# Altium footprint library TX2-Baseboard.PcbLib: 47 footprints (part 2 of 3)
Each footprint in its own frame and in the unit in brackets; x right, y up, seen from the top. Pads: shape width x height; smd on the part's side, far side on the other; paste and mask are expansions set on the pad; w line width, h text height; cw(c..) or ccw(c..) is an arc to the next point about the centre after c.
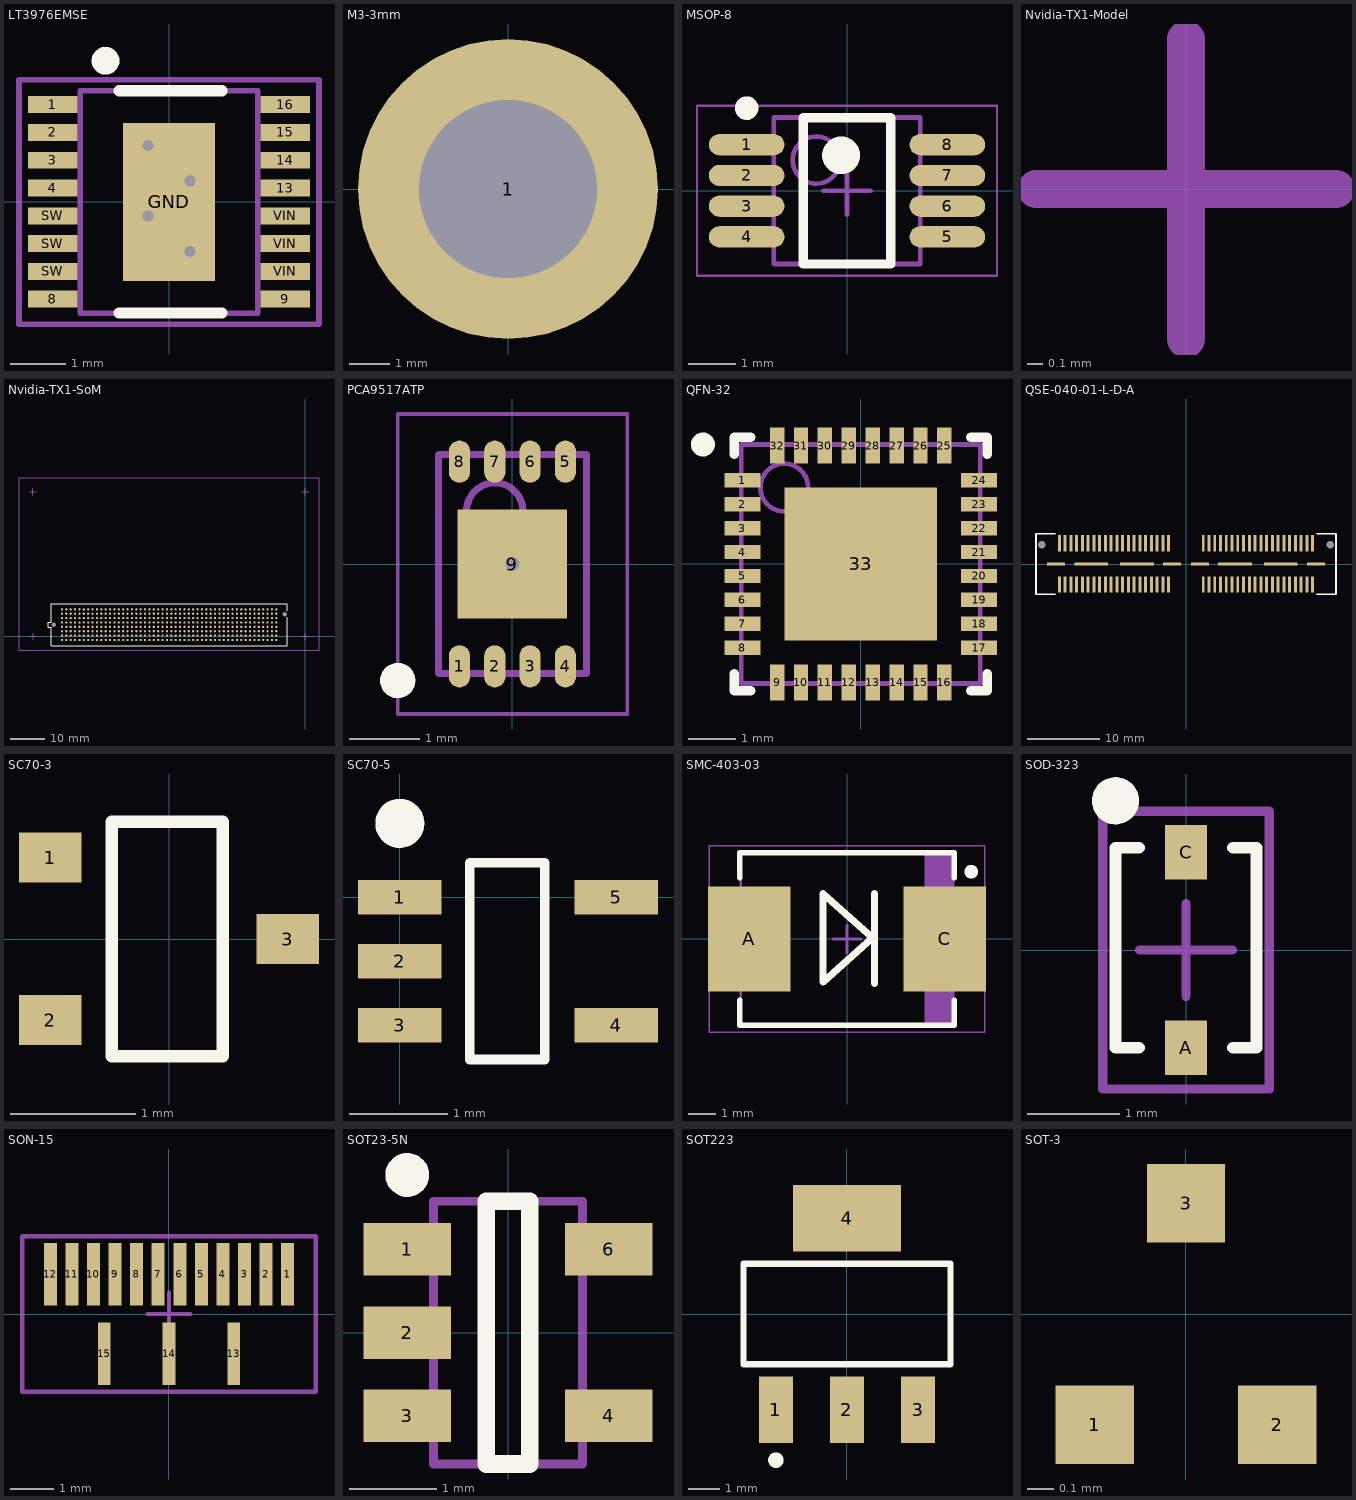
[diagram p1: the footprints below, top view; thin cyan lines are the x and y axes]

## LT3976EMSE [mm]
height 1.1
pads (17):
  rect 0.889x0.305 smd: 1(-2.095,1.75) 2(-2.095,1.25) 3(-2.095,0.75) 4(-2.095,0.25) 8(-2.095,-1.75) 9(2.095,-1.75) 13(2.095,0.25) 14(2.095,0.75) 15(2.095,1.25) 16(2.095,1.75) SW(-2.095,-1.25) SW(-2.095,-0.75) SW(-2.095,-0.25) VIN(2.095,-1.25) VIN(2.095,-0.75) VIN(2.095,-0.25)
  rect 1.651x2.845 smd: GND(0,0)
via 0.381,-0.889 diameter 0.55 hole 0.2
via -0.381,-0.254 diameter 0.55 hole 0.2
via 0.381,0.381 diameter 0.55 hole 0.2
via -0.381,1.016 diameter 0.55 hole 0.2
Top Overlay:
  circle w0.25: c-1.143,2.54 r0.125
  lines w0.2: -0.895,-2 0.954,-2 ; -0.895,2 0.954,2
Mechanical 13:
  lines w0.1: -1.6,-2 1.6,-2 1.6,2 -1.6,2 -1.6,-2
Mechanical 15:
  lines w0.1: -0.5,0 0.5,0 ; 0,-0.5 0,0.5 ; -2.7,-2.2 2.7,-2.2 2.7,2.2 -0.5,2.2 -2.7,2.2 -2.7,-2.2
3D body: height 1.1, standoff 0.1, extent -1.651,-2.032 1.651,2.032

## M3-3mm [mm] "SMT Steel Spacer, M3 Thread Internal, 3mm"
height 3
pads (1):
  round 7.4 / inner round 0 / far side round 0 hole 4.4 unplated paste-403.566: 1(0,0)
Top Paste:
  drawing of 4 lines, arcs and shapes, not listed
Mechanical 13:
  circle w0.12: c0,0 r3
3D body: height 3, standoff -1.4, extent -2.994,-3 2.994,2.976

## MSOP-8 [mm]
height 1.1
pads (8):
  oval 1.6x0.45 smd: 1(-2.125,0.975) 2(-2.125,0.325) 3(-2.125,-0.325) 4(-2.125,-0.975) 5(2.125,-0.975) 6(2.125,-0.325) 7(2.125,0.325) 8(2.125,0.975)
Top Overlay:
  circle w0.25: c-2.125,1.75 r0.125
  circle w0.4: c-0.125,0.75 r0.2
  lines w0.2: -0.925,-1.55 -0.925,1.55 0.925,1.55 0.925,-1.55 -0.925,-1.55
Mechanical 13:
  circle w0.1: c-0.65,0.65 r0.5
  lines w0.1: -1.55,-1.55 -1.55,1.55 1.55,1.55 1.55,-1.55 -1.55,-1.55
Mechanical 15:
  lines w0.05: -3.175,-1.8 -3.175,1.8 3.175,1.8 3.175,-1.8 -3.175,-1.8
  lines w0.1: -0.5,0 0.5,0 ; 0,-0.5 0,0.5
3D body: height 1.15, standoff 0, extent -2.45,-1.524 2.45,1.476

## Nvidia-TX1-Model [mm]
Mechanical 3:
  lines w0.254: -1,0 1,0 ; 0,-1 0,1
3D body: height 14.16, standoff 1.95, extent -4,-46 83,4

## Nvidia-TX1-SoM [mm]
pads (402):
  round 0 hole 1.27: 0(-73.033,3.43) 0(-5.953,6.48)
  round 0.64 smd: A1(-70.609,-1.015) A2(-69.339,-1.015) A3(-68.069,-1.015) A4(-66.799,-1.015) A5(-65.529,-1.015) A6(-64.259,-1.015) A7(-62.989,-1.015) A8(-61.719,-1.015) A9(-60.449,-1.015) A10(-59.179,-1.015) A11(-57.909,-1.015) A12(-56.639,-1.015) A13(-55.369,-1.015) A14(-54.099,-1.015) A15(-52.829,-1.015) A16(-51.559,-1.015) A17(-50.289,-1.015) A18(-49.019,-1.015) A19(-47.749,-1.015) A20(-46.479,-1.015) A21(-45.209,-1.015) A22(-43.939,-1.015) A23(-42.669,-1.015) A24(-41.399,-1.015) A25(-40.129,-1.015) A26(-38.859,-1.015) A27(-37.589,-1.015) A28(-36.319,-1.015) A29(-35.049,-1.015) A30(-33.779,-1.015) A31(-32.509,-1.015) A32(-31.239,-1.015) A33(-29.969,-1.015) A34(-28.699,-1.015) A35(-27.429,-1.015) A36(-26.159,-1.015) A37(-24.889,-1.015) A38(-23.619,-1.015) A39(-22.349,-1.015) A40(-21.079,-1.015) A41(-19.809,-1.015) A42(-18.539,-1.015) A43(-17.269,-1.015) A44(-15.999,-1.015) A45(-14.729,-1.015) A46(-13.459,-1.015) A47(-12.189,-1.015) A48(-10.919,-1.015) A49(-9.649,-1.015) A50(-8.379,-1.015) B1(-70.609,0.255) B2(-69.339,0.255) B3(-68.069,0.255) B4(-66.799,0.255) B5(-65.529,0.255) B6(-64.259,0.255) B7(-62.989,0.255) B8(-61.719,0.255) B9(-60.449,0.255) B10(-59.179,0.255) B11(-57.909,0.255) B12(-56.639,0.255) B13(-55.369,0.255) B14(-54.099,0.255) B15(-52.829,0.255) B16(-51.559,0.255) B17(-50.289,0.255) B18(-49.019,0.255) B19(-47.749,0.255) B20(-46.479,0.255) B21(-45.209,0.255) B22(-43.939,0.255) B23(-42.669,0.255) B24(-41.399,0.255) B25(-40.129,0.255) B26(-38.859,0.255) B27(-37.589,0.255) B28(-36.319,0.255) B29(-35.049,0.255) B30(-33.779,0.255) B31(-32.509,0.255) B32(-31.239,0.255) B33(-29.969,0.255) B34(-28.699,0.255) B35(-27.429,0.255) B36(-26.159,0.255) B37(-24.889,0.255) B38(-23.619,0.255) B39(-22.349,0.255) B40(-21.079,0.255) B41(-19.809,0.255) B42(-18.539,0.255) B43(-17.269,0.255) B44(-15.999,0.255) B45(-14.729,0.255) B46(-13.459,0.255) B47(-12.189,0.255) B48(-10.919,0.255) B49(-9.649,0.255) B50(-8.379,0.255) C1(-70.609,1.525) C2(-69.339,1.525) C3(-68.069,1.525) C4(-66.799,1.525) C5(-65.529,1.525) C6(-64.259,1.525) C7(-62.989,1.525) C8(-61.719,1.525) C9(-60.449,1.525) C10(-59.179,1.525) C11(-57.909,1.525) C12(-56.639,1.525) C13(-55.369,1.525) C14(-54.099,1.525) C15(-52.829,1.525) C16(-51.559,1.525) C17(-50.289,1.525) C18(-49.019,1.525) C19(-47.749,1.525) C20(-46.479,1.525) C21(-45.209,1.525) C22(-43.939,1.525) C23(-42.669,1.525) C24(-41.399,1.525) C25(-40.129,1.525) C26(-38.859,1.525) C27(-37.589,1.525) C28(-36.319,1.525) C29(-35.049,1.525) C30(-33.779,1.525) C31(-32.509,1.525) C32(-31.239,1.525) C33(-29.969,1.525) C34(-28.699,1.525) C35(-27.429,1.525) C36(-26.159,1.525) C37(-24.889,1.525) C38(-23.619,1.525) C39(-22.349,1.525) C40(-21.079,1.525) C41(-19.809,1.525) C42(-18.539,1.525) C43(-17.269,1.525) C44(-15.999,1.525) C45(-14.729,1.525) C46(-13.459,1.525) C47(-12.189,1.525) C48(-10.919,1.525) C49(-9.649,1.525) C50(-8.379,1.525) D1(-70.609,2.795) D2(-69.339,2.795) D3(-68.069,2.795) D4(-66.799,2.795) D5(-65.529,2.795) D6(-64.259,2.795) D7(-62.989,2.795) D8(-61.719,2.795) D9(-60.449,2.795) D10(-59.179,2.795) D11(-57.909,2.795) D12(-56.639,2.795) D13(-55.369,2.795) D14(-54.099,2.795) D15(-52.829,2.795) D16(-51.559,2.795) D17(-50.289,2.795) D18(-49.019,2.795) D19(-47.749,2.795) D20(-46.479,2.795) D21(-45.209,2.795) D22(-43.939,2.795) D23(-42.669,2.795) D24(-41.399,2.795) D25(-40.129,2.795) D26(-38.859,2.795) D27(-37.589,2.795) D28(-36.319,2.795) D29(-35.049,2.795) D30(-33.779,2.795) D31(-32.509,2.795) D32(-31.239,2.795) D33(-29.969,2.795) D34(-28.699,2.795) D35(-27.429,2.795) D36(-26.159,2.795) D37(-24.889,2.795) D38(-23.619,2.795) D39(-22.349,2.795) D40(-21.079,2.795) D41(-19.809,2.795) D42(-18.539,2.795) D43(-17.269,2.795) D44(-15.999,2.795) D45(-14.729,2.795) D46(-13.459,2.795) D47(-12.189,2.795) D48(-10.919,2.795) D49(-9.649,2.795) D50(-8.379,2.795) E1(-70.609,4.065) E2(-69.339,4.065) E3(-68.069,4.065) E4(-66.799,4.065) E5(-65.529,4.065) E6(-64.259,4.065) E7(-62.989,4.065) E8(-61.719,4.065) E9(-60.449,4.065) E10(-59.179,4.065) E11(-57.909,4.065) E12(-56.639,4.065) E13(-55.369,4.065) E14(-54.099,4.065) E15(-52.829,4.065) E16(-51.559,4.065) E17(-50.289,4.065) E18(-49.019,4.065) E19(-47.749,4.065) E20(-46.479,4.065) E21(-45.209,4.065) E22(-43.939,4.065) E23(-42.669,4.065) E24(-41.399,4.065) E25(-40.129,4.065) E26(-38.859,4.065) E27(-37.589,4.065) E28(-36.319,4.065) E29(-35.049,4.065) E30(-33.779,4.065) E31(-32.509,4.065) E32(-31.239,4.065) E33(-29.969,4.065) E34(-28.699,4.065) E35(-27.429,4.065) E36(-26.159,4.065) E37(-24.889,4.065) E38(-23.619,4.065) E39(-22.349,4.065) E40(-21.079,4.065) E41(-19.809,4.065) E42(-18.539,4.065) E43(-17.269,4.065) E44(-15.999,4.065) E45(-14.729,4.065) E46(-13.459,4.065) E47(-12.189,4.065) E48(-10.919,4.065) E49(-9.649,4.065) E50(-8.379,4.065) F1(-70.609,5.335) F2(-69.339,5.335) F3(-68.069,5.335) F4(-66.799,5.335) F5(-65.529,5.335) F6(-64.259,5.335) F7(-62.989,5.335) F8(-61.719,5.335) F9(-60.449,5.335) F10(-59.179,5.335) F11(-57.909,5.335) F12(-56.639,5.335) F13(-55.369,5.335) F14(-54.099,5.335) F15(-52.829,5.335) F16(-51.559,5.335) F17(-50.289,5.335) F18(-49.019,5.335) F19(-47.749,5.335) F20(-46.479,5.335) F21(-45.209,5.335) F22(-43.939,5.335) F23(-42.669,5.335) F24(-41.399,5.335) F25(-40.129,5.335) F26(-38.859,5.335) F27(-37.589,5.335) F28(-36.319,5.335) F29(-35.049,5.335) F30(-33.779,5.335) F31(-32.509,5.335) F32(-31.239,5.335) F33(-29.969,5.335) F34(-28.699,5.335) F35(-27.429,5.335) F36(-26.159,5.335) F37(-24.889,5.335) F38(-23.619,5.335) F39(-22.349,5.335) F40(-21.079,5.335) F41(-19.809,5.335) F42(-18.539,5.335) F43(-17.269,5.335) F44(-15.999,5.335) F45(-14.729,5.335) F46(-13.459,5.335) F47(-12.189,5.335) F48(-10.919,5.335) F49(-9.649,5.335) F50(-8.379,5.335) G1(-70.609,6.605) G2(-69.339,6.605) G3(-68.069,6.605) G4(-66.799,6.605) G5(-65.529,6.605) G6(-64.259,6.605) G7(-62.989,6.605) G8(-61.719,6.605) G9(-60.449,6.605) G10(-59.179,6.605) G11(-57.909,6.605) G12(-56.639,6.605) G13(-55.369,6.605) G14(-54.099,6.605) G15(-52.829,6.605) G16(-51.559,6.605) G17(-50.289,6.605) G18(-49.019,6.605) G19(-47.749,6.605) G20(-46.479,6.605) G21(-45.209,6.605) G22(-43.939,6.605) G23(-42.669,6.605) G24(-41.399,6.605) G25(-40.129,6.605) G26(-38.859,6.605) G27(-37.589,6.605) G28(-36.319,6.605) G29(-35.049,6.605) G30(-33.779,6.605) G31(-32.509,6.605) G32(-31.239,6.605) G33(-29.969,6.605) G34(-28.699,6.605) G35(-27.429,6.605) G36(-26.159,6.605) G37(-24.889,6.605) G38(-23.619,6.605) G39(-22.349,6.605) G40(-21.079,6.605) G41(-19.809,6.605) G42(-18.539,6.605) G43(-17.269,6.605) G44(-15.999,6.605) G45(-14.729,6.605) G46(-13.459,6.605) G47(-12.189,6.605) G48(-10.919,6.605) G49(-9.649,6.605) G50(-8.379,6.605) H1(-70.609,7.875) H2(-69.339,7.875) H3(-68.069,7.875) H4(-66.799,7.875) H5(-65.529,7.875) H6(-64.259,7.875) H7(-62.989,7.875) H8(-61.719,7.875) H9(-60.449,7.875) H10(-59.179,7.875) H11(-57.909,7.875) H12(-56.639,7.875) H13(-55.369,7.875) H14(-54.099,7.875) H15(-52.829,7.875) H16(-51.559,7.875) H17(-50.289,7.875) H18(-49.019,7.875) H19(-47.749,7.875) H20(-46.479,7.875) H21(-45.209,7.875) H22(-43.939,7.875) H23(-42.669,7.875) H24(-41.399,7.875) H25(-40.129,7.875) H26(-38.859,7.875) H27(-37.589,7.875) H28(-36.319,7.875) H29(-35.049,7.875) H30(-33.779,7.875) H31(-32.509,7.875) H32(-31.239,7.875) H33(-29.969,7.875) H34(-28.699,7.875) H35(-27.429,7.875) H36(-26.159,7.875) H37(-24.889,7.875) H38(-23.619,7.875) H39(-22.349,7.875) H40(-21.079,7.875) H41(-19.809,7.875) H42(-18.539,7.875) H43(-17.269,7.875) H44(-15.999,7.875) H45(-14.729,7.875) H46(-13.459,7.875) H47(-12.189,7.875) H48(-10.919,7.875) H49(-9.649,7.875) H50(-8.379,7.875)
Top Overlay:
  lines w0.15: -5.253,5.6 -5.253,-2.64 -73.733,-2.64 -73.733,2.67 -74.623,2.67 -74.623,4.19 -73.733,4.19 -73.733,9.5 -5.253,9.5 -5.253,7.475
Mechanical 3:
  lines w0.1: -83.075,-4 4.025,-4 4.025,46.075 -83.075,46.075 -83.075,-4
  lines w0.254: -80,0 -78,0 ; -80,42 -78,42 ; -79.025,41.025 -79.025,43.025 ; -79,-1 -79,1 ; -1,0 1,0 ; -1,42 1,42 ; 0,-1 0,1 ; 0,41 0,43
3D body: height 5.54, standoff -1.34, extent -74.608,-2.64 -5.241,9.501

## PCA9517ATP [mm]
height 0.75
pads (9):
  oval 0.3x0.6 smd: 1(-0.75,-1.45) 2(-0.25,-1.45) 3(0.25,-1.45) 4(0.75,-1.45) 5(0.75,1.45) 6(0.25,1.45) 7(-0.25,1.45) 8(-0.75,1.45)
  rect 1.55x1.55 smd: 9(0,0)
via 0,0 diameter 0.5 hole 0.2
Top Overlay:
  circle w0.25: c-1.625,-1.651 r0.125
Mechanical 13:
  circle w0.1: c-0.25,0.75 r0.4
  lines w0.1: -1.05,-1.55 1.05,-1.55 1.05,1.55 -1.05,1.55 -1.05,-1.55
Mechanical 15:
  lines w0.05: -1.625,-2.125 1.625,-2.125 1.625,2.125 -1.625,2.125 -1.625,-2.125
  lines w0.1: -0.5,0 0.5,0 ; 0,-0.5 0,0.5
3D body: height 0.75, standoff 0.02, extent -1.05,-1.55 1.05,1.55

## QFN-32 [mm] "QFN, 32-Leads, Body 5,00x5,00mm, Pitch 0,50mm, Thermal Pad 3,20x3,20mm, IPC Medium Density"
height 1
pads (33):
  rect 0.75x0.3 smd: 1(-2.475,1.75) 2(-2.475,1.25) 3(-2.475,0.75) 4(-2.475,0.25) 5(-2.475,-0.25) 6(-2.475,-0.75) 7(-2.475,-1.25) 8(-2.475,-1.75) 17(2.475,-1.75) 18(2.475,-1.25) 19(2.475,-0.75) 20(2.475,-0.25) 21(2.475,0.25) 22(2.475,0.75) 23(2.475,1.25) 24(2.475,1.75)
  rect 0.3x0.75 smd: 9(-1.75,-2.475) 10(-1.25,-2.475) 11(-0.75,-2.475) 12(-0.25,-2.475) 13(0.25,-2.475) 14(0.75,-2.475) 15(1.25,-2.475) 16(1.75,-2.475) 25(1.75,2.475) 26(1.25,2.475) 27(0.75,2.475) 28(0.25,2.475) 29(-0.25,2.475) 30(-0.75,2.475) 31(-1.25,2.475) 32(-1.75,2.475)
  rect 3.2x3.2 smd: 33(0,0)
Top Overlay:
  circle w0.25: c-3.3,2.5 r0.125
  lines w0.2: -2.65,-2.3 -2.65,-2.65 -2.3,-2.65 ; -2.65,2.3 -2.65,2.65 -2.3,2.65 ; 2.3,-2.65 2.65,-2.65 2.65,-2.3 ; 2.3,2.65 2.65,2.65 2.65,2.3
Mechanical 13:
  circle w0.1: c-1.6,1.6 r0.5
  lines w0.1: -2.5,-2.5 2.5,-2.5 2.5,2.5 -2.5,2.5 -2.5,-2.5
3D body: height 0.25, standoff 0, extent -2.5,-2.5 2.5,2.5
3D body: height 1, standoff 0.05, extent -2.5,-2.5 2.5,2.5

## QSE-040-01-L-D-A [mm]
pads (90):
  round 0 hole 1.02: 0(-20.065,2.665) 0(20.065,2.665)
  rect 0.41x2.27 smd: 1(-17.603,-2.86) 2(-17.603,2.87) 3(-16.803,-2.86) 4(-16.803,2.87) 5(-16.003,-2.86) 6(-16.003,2.87) 7(-15.203,-2.86) 8(-15.203,2.87) 9(-14.403,-2.86) 10(-14.403,2.87) 11(-13.603,-2.86) 12(-13.603,2.87) 13(-12.803,-2.86) 14(-12.803,2.87) 15(-12.003,-2.86) 16(-12.003,2.87) 17(-11.203,-2.86) 18(-11.203,2.87) 19(-10.403,-2.86) 20(-10.403,2.87) 21(-9.603,-2.86) 22(-9.603,2.87) 23(-8.803,-2.86) 24(-8.803,2.87) 25(-8.003,-2.86) 26(-8.003,2.87) 27(-7.203,-2.86) 28(-7.203,2.87) 29(-6.403,-2.86) 30(-6.403,2.87) 31(-5.603,-2.86) 32(-5.603,2.87) 33(-4.803,-2.86) 34(-4.803,2.87) 35(-4.003,-2.86) 36(-4.003,2.87) 37(-3.203,-2.86) 38(-3.203,2.87) 39(-2.403,-2.86) 40(-2.403,2.87) 41(2.4,-2.86) 42(2.4,2.87) 43(3.2,-2.86) 44(3.2,2.87) 45(4,-2.86) 46(4,2.87) 47(4.8,-2.86) 48(4.8,2.87) 49(5.6,-2.86) 50(5.6,2.87) 51(6.4,-2.86) 52(6.4,2.87) 53(7.2,-2.86) 54(7.2,2.87) 55(8,-2.86) 56(8,2.87) 57(8.8,-2.86) 58(8.8,2.87) 59(9.6,-2.86) 60(9.6,2.87) 61(10.4,-2.86) 62(10.4,2.87) 63(11.2,-2.86) 64(11.2,2.87) 65(12,-2.86) 66(12,2.87) 67(12.8,-2.86) 68(12.8,2.87) 69(13.6,-2.86) 70(13.6,2.87) 71(14.4,-2.86) 72(14.4,2.87) 73(15.2,-2.86) 74(15.2,2.87) 75(16,-2.86) 76(16,2.87) 77(16.8,-2.86) 78(16.8,2.87) 79(17.6,-2.86) 80(17.6,2.87)
  rect 2.54x0.43 smd: 81(-18.069,-0.002) 84(-1.942,-0.002) 85(1.942,-0.001) 88(18.069,-0.001)
  rect 4.7x0.43 smd: 82(-13.178,-0.002) 83(-6.832,-0.001) 86(6.832,-0.001) 87(13.178,-0.001)
Top Overlay:
  lines w0.254: -18.2,-4.2 -20.86,-4.2 -20.86,4.2 -18.2,4.2 ; 18.2,-4.2 20.86,-4.2 20.86,4.2 18.2,4.2
3D body: height 3.23, standoff -0.34, extent -20.64,-3.737 20.635,3.756

## SC70-3 [mm] "SC70, 3-Leads, Pitch 0,65mm, EIAJ SC-88a"
height 1.1
pads (3):
  rect 0.5x0.4 smd: 1(-0.95,0.65) 2(-0.95,-0.65) 3(0.95,0)
Top Overlay:
  lines w0.1: -0.457,-0.94 0.432,-0.94 0.432,0.94 -0.457,0.94 -0.457,-0.94
3D body: height 1, standoff 0, extent -1.15,-1.075 1.15,1.025

## SC70-5 [mm] "SC70, 5-Leads, Pitch 0,65mm, EIAJ SC-88a"
height 1.1
pads (5):
  rect 0.85x0.35 smd: 1(0,0) 2(0,-0.65) 3(0,-1.3) 4(2.2,-1.3) 5(2.2,0)
Top Overlay:
  circle w0.25: c0,0.75 r0.125
  lines w0.1: 0.711,-1.65 1.473,-1.65 1.473,0.35 0.711,0.35 0.711,-1.65
3D body: height 0.96, standoff 0.01, extent 0.068,-1.635 2.168,0.365

## SMC-403-03 [mm] "SMC-403-03 package"
height 2.13
pads (2):
  rect 3x3.81 smd: A(-3.56,0) C(3.56,0)
Top Overlay:
  circle w0.25: c4.525,2.45 r0.125
  lines w0.2: -3.9,-2.225 -3.9,-3.15 3.9,-3.15 3.9,-2.225 ; -3.9,2.225 -3.9,3.15 3.9,3.15 3.9,2.225
  lines w0.254: 1,-1.625 1,1.65 ; -0.875,-1.575 -0.875,1.65 0.925,0.05 -0.875,-1.575
Mechanical 13:
  rectangle: 2.833,-3.126 3.875,3.124
  lines w0.1: -3.875,-3.125 3.875,-3.125 3.875,3.125 -3.875,3.125 -3.875,-3.125
Mechanical 15:
  lines w0.05: -5.025,-3.4 5.025,-3.4 5.025,3.4 -5.025,3.4 -5.025,-3.4
  lines w0.1: -0.5,0 0.5,0 ; 0,-0.5 0,0.5
3D body: height 2.2, standoff 0, extent -4.125,-3.125 3.875,2.825

## SOD-323 [mm]
pads (2):
  rect 0.45x0.59 smd: A(0,-1.055) C(0,1.055)
Top Overlay:
  circle w0.254: c-0.762,1.612 r0.127
  lines w0.127: -0.508,-1.055 -0.762,-1.055 -0.762,1.104 -0.508,1.104 ; 0.508,-1.055 0.762,-1.055 0.762,1.104 0.508,1.104
Mechanical 15:
  lines w0.1: -0.5,0 0.5,0 ; 0,-0.5 0,0.5 ; -0.9,-1.5 -0.9,1.5 0,1.5 0.9,1.5 0.9,-1.5 -0.9,-1.5
3D body: height 1, standoff 0.01, extent -0.625,-1.25 0.625,1.25

## SON-15 [mm]
height 0.8
pads (15):
  rect 0.3x1.45 smd: 1(2.75,0.925) 2(2.25,0.925) 3(1.75,0.925) 4(1.25,0.925) 5(0.75,0.925) 6(0.25,0.925) 7(-0.25,0.925) 8(-0.75,0.925) 9(-1.25,0.925) 10(-1.75,0.925) 11(-2.25,0.925) 12(-2.75,0.925) 13(1.5,-0.925) 14(0,-0.925) 15(-1.5,-0.925)
Mechanical 15:
  lines w0.1: -0.5,0 0.5,0 ; 0,-0.5 0,0.5 ; -3.4,-1.8 3.3,-1.8 3.4,-1.8 3.4,1.8 3.3,1.8 -3.3,1.8 -3.4,1.8 -3.4,-1.8
3D body: height 0.8, standoff -0.01, extent -3.3,-1.3 3.3,1.3

## SOT23-5N [mm] "SOT23, 5-Leads, Body 2,90x2,70mm, Pitch 0,95mm, IPC Medium Density"
height 1.45
pads (5):
  rect 1x0.6 smd: 1(-1.15,0.95) 2(-1.15,0) 3(-1.15,-0.95) 4(1.15,-0.95) 6(1.15,0.95)
Top Overlay:
  circle w0.25: c-1.15,1.8 r0.125
  lines w0.2: -0.25,-1.5 0.25,-1.5 0.25,1.5 -0.25,1.5 -0.25,-1.5
Mechanical 13:
  lines w0.1: -0.85,-1.5 -0.85,1.5 0.85,1.5 0.85,-1.5 -0.85,-1.5
3D body: height 1.45, standoff 0.1, extent -0.85,-1.5 0.85,1.5

## SOT223 [mm] "SOT-223/SC-73; 4 Leads; Body 6.7 x 7.3 mm, inc. leads (LxW max)"
height 1.8
pads (4):
  rect 1.1x2.15 smd: 1(-2.3,-3.1) 2(0,-3.1) 3(2.3,-3.1)
  rect 3.5x2.15 smd: 4(0,3.1)
Top Overlay:
  circle w0.25: c-2.3,-4.725 r0.125
  lines w0.2: -3.35,-1.625 -3.35,1.625 3.35,1.625 3.35,-1.625 -3.35,-1.625
3D body: height 1.61, standoff -0.07, extent -3.25,-3.48 3.25,3.48

## SOT-3 [mm]
height 0.5
pads (3):
  rect 0.3x0.3 smd: 1(-0.35,-0.425) 2(0.35,-0.425) 3(0,0.425)
3D body: height 0.51, standoff 0, extent -0.508,-0.381 0.508,0.381